# Altium footprint library heromap.PcbLib: 593 footprints (part 2 of 38)
Each footprint in its own frame and in the unit in brackets; x right, y up, seen from the top. Pads: shape width x height; smd on the part's side, far side on the other; paste and mask are expansions set on the pad; w line width, h text height; cw(c..) or ccw(c..) is an arc to the next point about the centre after c.
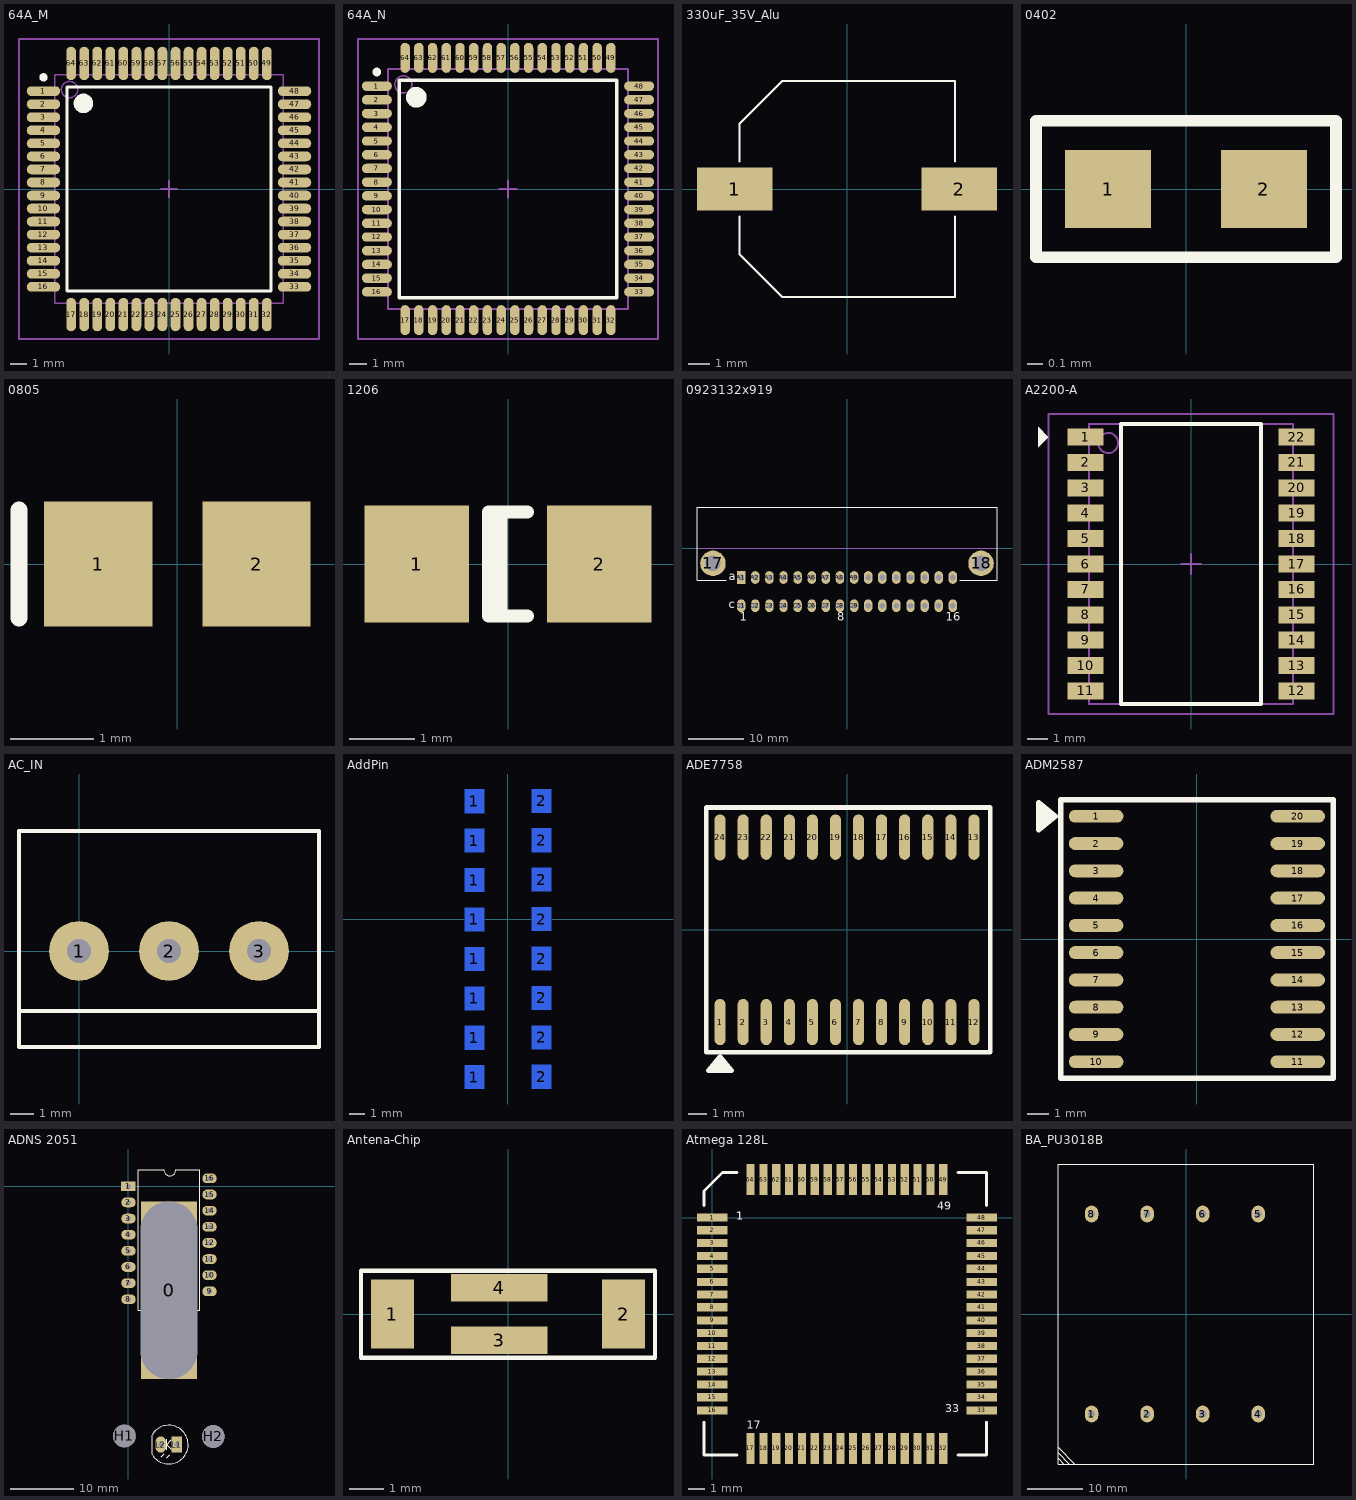
[diagram p1: the footprints below, top view; thin cyan lines are the x and y axes]

## 64A_M [mm] "Thin QFP, 64-Leads, Body 14x14mm, Pitch 0.8mm, IPC Low Density"
height 1.2
pads (64):
  oval 2.05x0.6 smd: 1(-7.7,6) 2(-7.7,5.2) 3(-7.7,4.4) 4(-7.7,3.6) 5(-7.7,2.8) 6(-7.7,2) 7(-7.7,1.2) 8(-7.7,0.4) 9(-7.7,-0.4) 10(-7.7,-1.2) 11(-7.7,-2) 12(-7.7,-2.8) 13(-7.7,-3.6) 14(-7.7,-4.4) 15(-7.7,-5.2) 16(-7.7,-6) 33(7.7,-6) 34(7.7,-5.2) 35(7.7,-4.4) 36(7.7,-3.6) 37(7.7,-2.8) 38(7.7,-2) 39(7.7,-1.2) 40(7.7,-0.4) 41(7.7,0.4) 42(7.7,1.2) 43(7.7,2) 44(7.7,2.8) 45(7.7,3.6) 46(7.7,4.4) 47(7.7,5.2) 48(7.7,6)
  oval 0.6x2.05 smd: 17(-6,-7.7) 18(-5.2,-7.7) 19(-4.4,-7.7) 20(-3.6,-7.7) 21(-2.8,-7.7) 22(-2,-7.7) 23(-1.2,-7.7) 24(-0.4,-7.7) 25(0.4,-7.7) 26(1.2,-7.7) 27(2,-7.7) 28(2.8,-7.7) 29(3.6,-7.7) 30(4.4,-7.7) 31(5.2,-7.7) 32(6,-7.7) 49(6,7.7) 50(5.2,7.7) 51(4.4,7.7) 52(3.6,7.7) 53(2.8,7.7) 54(2,7.7) 55(1.2,7.7) 56(0.4,7.7) 57(-0.4,7.7) 58(-1.2,7.7) 59(-2,7.7) 60(-2.8,7.7) 61(-3.6,7.7) 62(-4.4,7.7) 63(-5.2,7.7) 64(-6,7.7)
Top Overlay:
  circle w0.25: c-7.7,6.85 r0.125
  circle w0.6: c-5.25,5.25 r0.3
  lines w0.2: -6.25,-6.25 -6.25,6.25 6.25,6.25 6.25,-6.25 -6.25,-6.25
Mechanical 13:
  circle w0.1: c-6.1,6.1 r0.5
  lines w0.1: -7,-7 -7,7 7,7 7,-7 -7,-7
Mechanical 15:
  lines w0.1: -0.5,0 0.5,0 ; 0,-0.5 0,0.5 ; -9.2,-9.2 -9.2,9.2 9.2,9.2 9.2,-9.2 -9.2,-9.2
3D body: height 1.2, standoff 0, extent -7,-7 7,7

## 64A_N [mm] "Thin QFP, 64-Leads, Body 14x14mm, Pitch 0.8mm, IPC Medium Density"
height 1.2
pads (64):
  oval 1.75x0.55 smd: 1(-7.65,6) 2(-7.65,5.2) 3(-7.65,4.4) 4(-7.65,3.6) 5(-7.65,2.8) 6(-7.65,2) 7(-7.65,1.2) 8(-7.65,0.4) 9(-7.65,-0.4) 10(-7.65,-1.2) 11(-7.65,-2) 12(-7.65,-2.8) 13(-7.65,-3.6) 14(-7.65,-4.4) 15(-7.65,-5.2) 16(-7.65,-6) 33(7.65,-6) 34(7.65,-5.2) 35(7.65,-4.4) 36(7.65,-3.6) 37(7.65,-2.8) 38(7.65,-2) 39(7.65,-1.2) 40(7.65,-0.4) 41(7.65,0.4) 42(7.65,1.2) 43(7.65,2) 44(7.65,2.8) 45(7.65,3.6) 46(7.65,4.4) 47(7.65,5.2) 48(7.65,6)
  oval 0.55x1.75 smd: 17(-6,-7.65) 18(-5.2,-7.65) 19(-4.4,-7.65) 20(-3.6,-7.65) 21(-2.8,-7.65) 22(-2,-7.65) 23(-1.2,-7.65) 24(-0.4,-7.65) 25(0.4,-7.65) 26(1.2,-7.65) 27(2,-7.65) 28(2.8,-7.65) 29(3.6,-7.65) 30(4.4,-7.65) 31(5.2,-7.65) 32(6,-7.65) 49(6,7.65) 50(5.2,7.65) 51(4.4,7.65) 52(3.6,7.65) 53(2.8,7.65) 54(2,7.65) 55(1.2,7.65) 56(0.4,7.65) 57(-0.4,7.65) 58(-1.2,7.65) 59(-2,7.65) 60(-2.8,7.65) 61(-3.6,7.65) 62(-4.4,7.65) 63(-5.2,7.65) 64(-6,7.65)
Top Overlay:
  circle w0.6: c-5.35,5.35 r0.3
  circle w0.25: c-7.65,6.825 r0.125
  lines w0.2: -6.35,-6.35 6.35,-6.35 6.35,6.35 -6.35,6.35 -6.35,-6.35
Mechanical 13:
  circle w0.1: c-6.1,6.1 r0.5
  lines w0.1: -7,-7 7,-7 7,7 -7,7 -7,-7
Mechanical 15:
  lines w0.1: -0.5,0 0.5,0 ; 0,-0.5 0,0.5 ; -8.75,-8.75 8.75,-8.75 8.75,8.75 -8.75,8.75 -8.75,-8.75
3D body: height 1.2, standoff 0, extent -7,-7 7,7

## 330uF_35V_Alu [mm] "Tu 330uF/35V- 220uF/50V"
pads (2):
  rect 3.5x2 smd: 1(-5.2,0) 2(5.2,0)
Top Overlay:
  lines w0.102: -4.978,-1.27 -4.978,-3.023 -2.997,-5.004 ; -4.978,1.27 -4.978,3.023 -2.997,5.004 ; -3,-5 5,-5 5,-1.27 ; -3,5 5,5 5,1.27
3D body: height 10, standoff 2.6, extent -4.999,-4.999 4.999,4.999
3D body: height 2.1, standoff 0.2, extent -4.999,-4.999 4.999,4.999
3D body: height 2.6, standoff 2.1, extent -4.799,-4.799 4.799,4.799
3D body: height 10.01, standoff 10, extent 2.515,-4.318 5.004,4.318
3D body: height 0.2, standoff 0, extent -6.248,-0.508 -2.54,0.508
3D body: height 0.2, standoff 0, extent 2.54,-0.508 6.248,0.508
3D body: height 2.1, standoff 0.6, extent 1.27,-5.004 5.004,-1.016
3D body: height 2.1, standoff 0.6, extent 1.016,1.27 5.004,5.004
3D body: height 1.1, standoff 0.6, extent -4.978,-5.004 -1.245,-1.041
3D body: height 1.1, standoff 0.6, extent -4.978,1.27 -1.016,5.004
3D body: height 0.6, standoff 0.1, extent -4.978,-5.004 5.004,5.004

## 0402 [mil]
pads (2):
  rect 22x20 smd: 1(-20,0) 2(20,0)
Top Overlay:
  lines w3: -38.5,-17.5 -38.5,17.5 38.5,17.5 38.5,-17.5 -38.5,-17.5

## 0805 [mm] "Chip Capacitor; Body 2.0 x 1.2 mm (LxW typ)"
height 1.3
pads (2):
  rect 1.3x1.5 smd: 1(-0.95,0) 2(0.95,0)
Top Overlay:
  lines w0.2: -1.9,-0.65 -1.9,0.65

## 1206 [mm] "Chip Capacitor; Body 3.2 x 1.6 mm (LxW typ)"
height 1.5
pads (2):
  rect 1.6x1.8 smd: 1(-1.4,0) 2(1.4,0)
Top Overlay:
  lines w0.2: -0.11,-0.8 -0.11,0.8 ; 0.3,-0.8 -0.3,-0.8 -0.3,0.8 0.3,0.8

## 0923132x919 [mm] "Connector; DIN 41612, Type 2C, Thru-Hole; Rows a+c, 32 Position; Right Angle"
height 11.1
pads (34):
  round 4.6 hole 2.8: 17(-24.13,-2.76) 18(24.13,-2.76)
  rect 1.524x2.286 hole 1: A1(-19.05,-5.3)
  oval 1.524x2.286 hole 1: A2(-16.51,-5.3) A3(-13.97,-5.3) A4(-11.43,-5.3) A5(-8.89,-5.3) A6(-6.35,-5.3) A7(-3.81,-5.3) A8(-1.27,-5.3) A9(1.27,-5.3) A10(3.81,-5.3) A11(6.35,-5.3) A12(8.89,-5.3) A13(11.43,-5.3) A14(13.97,-5.3) A15(16.51,-5.3) A16(19.05,-5.3) C1(-19.05,-10.38) C2(-16.51,-10.38) C3(-13.97,-10.38) C4(-11.43,-10.38) C5(-8.89,-10.38) C6(-6.35,-10.38) C7(-3.81,-10.38) C8(-1.27,-10.38) C9(1.27,-10.38) C10(3.81,-10.38) C11(6.35,-10.38) C12(8.89,-10.38) C13(11.43,-10.38) C14(13.97,-10.38) C15(16.51,-10.38) C16(19.05,-10.38)
Top Overlay:
  lines w0.2: -21.75,-5.8 -27,-5.8 -27,7.34 27,7.34 27,-5.8 20.275,-5.8
  text "16" at 17.8,-13.08 h1.5
  text "8" at -1.77,-13.08 h1.5
  text "c" at -21.26,-10.88 h1.5
  text "a" at -21.26,-5.8 h1.5
  text "1" at -19.3,-13.08 h1.5
Mechanical 1:
  lines w0.1: -27,0 27,0
  text "PCB Edge" at -26.15,0.5 h0.6

## A2200-A [mm] "SOJ, 22-Leads, Body 14,0x12,0mm (max), Pitch 1,27mm, IPC Low Density"
height 0.8
pads (22):
  rect 1.8x0.85 smd: 1(-5.275,6.35) 2(-5.275,5.08) 3(-5.275,3.81) 4(-5.275,2.54) 5(-5.275,1.27) 6(-5.275,0) 7(-5.275,-1.27) 8(-5.275,-2.54) 9(-5.275,-3.81) 10(-5.275,-5.08) 11(-5.275,-6.35) 12(5.275,-6.35) 13(5.275,-5.08) 14(5.275,-3.81) 15(5.275,-2.54) 16(5.275,-1.27) 17(5.275,0) 18(5.275,1.27) 19(5.275,2.54) 20(5.275,3.81) 21(5.275,5.08) 22(5.275,6.35)
Top Overlay:
  region: -7.645,6.858 -7.137,6.35 -7.645,5.842
  lines w0.2: -3.5,-7 -3.5,7 3.5,7 3.5,-7 -3.5,-7
Mechanical 13:
  circle w0.1: c-4.15,6.05 r0.5
  lines w0.1: -5.1,-7 -5.1,7 5.1,7 5.1,-7 -5.1,-7
Mechanical 15:
  lines w0.1: -0.5,0 0.5,0 ; 0,-0.5 0,0.5 ; -7.125,-7.5 -7.125,7.5 7.125,7.5 7.125,-7.5 -7.125,-7.5
3D body: height 2, standoff 0.2, extent -4.394,-6.375 4.496,6.35
3D body: height 0.8, standoff 0.1, extent -5.1,-7 5.1,7

## AC_IN [mil] "AC_Input"
height 3
pads (3):
  round 100 hole 40 square: 1(0,0) 2(150,0) 3(300,0)
Top Overlay:
  lines w7: -100,-100 400,-100 ; -100,-160 400,-160 400,200 -100,200 -100,-160

## AddPin [mil] "Add"
pads (16):
  rect 50x60 smd far side: 1(-84,-400) 1(-84,-300) 1(-84,-200) 1(-84,-100) 1(-84,0) 1(-84,100) 1(-84,200) 1(-84,300) 2(86,-399) 2(86,-299) 2(86,-199) 2(86,-99) 2(86,1) 2(86,101) 2(86,201) 2(86,301)

## ADE7758 [mil]
pads (24):
  oval 24x100 smd: 1(-275,-200) 2(-225,-200) 3(-175,-200) 4(-125,-200) 5(-75,-200) 6(-25,-200) 7(25,-200) 8(75,-200) 9(125,-200) 10(175,-200) 11(225,-200) 12(275,-200) 24(-275,200)
  oval 24x98.43 smd: 13(275,200.79) 14(225,200.79) 15(175,200.79) 16(125,200.79) 17(75,200.79) 18(25,200.79) 19(-25,200.79) 20(-75,200.79) 21(-125,200.79) 22(-175,200.79) 23(-225,200.79)
Top Overlay:
  region: -275,-275 -300,-305 -250,-305
  lines w10: -305,-265 310,-265 310,265 -305,265 -305,-265 ; -300,-305 -275,-275 -250,-305 -300,-305
3D body: height 53.15, standoff 49.21, extent 265,137.01 285,187.01
3D body: height 53.15, standoff 0, extent 265,187.01 285,192.01
3D body: height 3.94, standoff 0, extent 265,192.01 285,222.01
3D body: height 3.94, standoff 0, extent 215,192.01 235,222.01
3D body: height 53.15, standoff 0, extent 215,187.01 235,192.01
3D body: height 53.15, standoff 49.21, extent 215,137.01 235,187.01
3D body: height 3.94, standoff 0, extent 165,192.01 185,222.01
3D body: height 53.15, standoff 0, extent 165,187.01 185,192.01
3D body: height 53.15, standoff 49.21, extent 165,137.01 185,187.01
3D body: height 3.94, standoff 0, extent 115,192.01 135,222.01
3D body: height 53.15, standoff 0, extent 115,187.01 135,192.01
3D body: height 53.15, standoff 49.21, extent 115,137.01 135,187.01
3D body: height 53.15, standoff 49.21, extent -85,137.01 -65,187.01
3D body: height 53.15, standoff 0, extent -85,187.01 -65,192.01
3D body: height 3.94, standoff 0, extent -85,192.01 -65,222.01
3D body: height 53.15, standoff 49.21, extent -35,137.01 -15,187.01
3D body: height 53.15, standoff 0, extent -35,187.01 -15,192.01
3D body: height 3.94, standoff 0, extent -35,192.01 -15,222.01
3D body: height 53.15, standoff 49.21, extent 15,137.01 35,187.01
3D body: height 53.15, standoff 0, extent 15,187.01 35,192.01
3D body: height 3.94, standoff 0, extent 15,192.01 35,222.01
3D body: height 3.94, standoff 0, extent 65,192.01 85,222.01
3D body: height 53.15, standoff 0, extent 65,187.01 85,192.01
3D body: height 53.15, standoff 49.21, extent 65,137.01 85,187.01
3D body: height 53.15, standoff 49.21, extent -285,137.01 -265,187.01
3D body: height 53.15, standoff 0, extent -285,187.01 -265,192.01
3D body: height 3.94, standoff 0, extent -285,192.01 -265,222.01
3D body: height 53.15, standoff 49.21, extent -235,137.01 -215,187.01
3D body: height 53.15, standoff 0, extent -235,187.01 -215,192.01
3D body: height 3.94, standoff 0, extent -235,192.01 -215,222.01
3D body: height 53.15, standoff 49.21, extent -185,137.01 -165,187.01
3D body: height 53.15, standoff 0, extent -185,187.01 -165,192.01
3D body: height 3.94, standoff 0, extent -185,192.01 -165,222.01
3D body: height 3.94, standoff 0, extent -135,192.01 -115,222.01
3D body: height 53.15, standoff 0, extent -135,187.01 -115,192.01
3D body: height 53.15, standoff 49.21, extent -135,137.01 -115,187.01
3D body: height 53.15, standoff 49.21, extent 115,-186.22 135,-136.22
3D body: height 53.15, standoff 0, extent 115,-191.22 135,-186.22
3D body: height 3.94, standoff 0, extent 115,-221.22 135,-191.22
3D body: height 3.94, standoff 0, extent 165,-221.22 185,-191.22
3D body: height 53.15, standoff 0, extent 165,-191.22 185,-186.22
3D body: height 53.15, standoff 49.21, extent 165,-186.22 185,-136.22
3D body: height 3.94, standoff 0, extent 215,-221.22 235,-191.22
3D body: height 53.15, standoff 0, extent 215,-191.22 235,-186.22
3D body: height 53.15, standoff 49.21, extent 215,-186.22 235,-136.22
3D body: height 3.94, standoff 0, extent 265,-221.22 285,-191.22
3D body: height 53.15, standoff 0, extent 265,-191.22 285,-186.22
3D body: height 53.15, standoff 49.21, extent 265,-186.22 285,-136.22
3D body: height 53.15, standoff 49.21, extent -85,-186.22 -65,-136.22
3D body: height 53.15, standoff 0, extent -85,-191.22 -65,-186.22
3D body: height 3.94, standoff 0, extent -85,-221.22 -65,-191.22
3D body: height 3.94, standoff 0, extent -35,-221.22 -15,-191.22
3D body: height 53.15, standoff 0, extent -35,-191.22 -15,-186.22
3D body: height 53.15, standoff 49.21, extent -35,-186.22 -15,-136.22
3D body: height 3.94, standoff 0, extent 15,-221.22 35,-191.22
3D body: height 53.15, standoff 0, extent 15,-191.22 35,-186.22
3D body: height 53.15, standoff 49.21, extent 15,-186.22 35,-136.22
3D body: height 3.94, standoff 0, extent 65,-221.22 85,-191.22
3D body: height 53.15, standoff 0, extent 65,-191.22 85,-186.22
3D body: height 53.15, standoff 49.21, extent 65,-186.22 85,-136.22
3D body: height 53.15, standoff 49.21, extent -135,-186.22 -115,-136.22
3D body: height 53.15, standoff 0, extent -135,-191.22 -115,-186.22
3D body: height 3.94, standoff 0, extent -135,-221.22 -115,-191.22
3D body: height 53.15, standoff 49.21, extent -185,-186.22 -165,-136.22
3D body: height 53.15, standoff 0, extent -185,-191.22 -165,-186.22
3D body: height 3.94, standoff 0, extent -185,-221.22 -165,-191.22
3D body: height 53.15, standoff 49.21, extent -235,-186.22 -215,-136.22
3D body: height 53.15, standoff 0, extent -235,-191.22 -215,-186.22
3D body: height 3.94, standoff 0, extent -235,-221.22 -215,-191.22
3D body: height 3.94, standoff 0, extent -285,-221.22 -265,-191.22
3D body: height 53.15, standoff 0, extent -285,-191.22 -265,-186.22
3D body: height 53.15, standoff 49.21, extent -285,-186.22 -265,-136.22
3D body: height 104.33, standoff 0, extent -299.98,-150 299.98,150

## ADM2587 [mm]
pads (20):
  oval 2.54x0.6 smd: 1(-4.695,5.715) 2(-4.695,4.445) 3(-4.695,3.175) 4(-4.695,1.905) 5(-4.695,0.635) 6(-4.695,-0.635) 7(-4.695,-1.905) 8(-4.695,-3.175) 9(-4.695,-4.445) 10(-4.695,-5.715) 11(4.695,-5.715) 12(4.695,-4.445) 13(4.695,-3.175) 14(4.695,-1.905) 15(4.695,-0.635) 16(4.695,0.635) 17(4.695,1.905) 18(4.695,3.175) 19(4.695,4.445) 20(4.695,5.715)
Top Overlay:
  region: -6.604,5.715 -7.366,6.35 -7.366,5.08
  lines w0.254: -7.366,5.08 -6.604,5.715 -7.366,6.35 -7.366,5.08 ; -6.35,-6.477 -6.35,6.477 6.35,6.477 6.35,-6.477 -6.35,-6.477
3D body: height 1.38, standoff 1.28, extent 3.658,-5.969 4.089,-5.461
3D body: height 1.38, standoff 0, extent 4.089,-5.969 4.191,-5.461
3D body: height 0.1, standoff 0, extent 4.191,-5.969 5.029,-5.461
3D body: height 0.1, standoff 0, extent 4.191,-4.699 5.029,-4.191
3D body: height 1.38, standoff 0, extent 4.089,-4.699 4.191,-4.191
3D body: height 1.38, standoff 1.28, extent 3.658,-4.699 4.089,-4.191
3D body: height 0.1, standoff 0, extent 4.191,-3.429 5.029,-2.921
3D body: height 1.38, standoff 0, extent 4.089,-3.429 4.191,-2.921
3D body: height 1.38, standoff 1.28, extent 3.658,-3.429 4.089,-2.921
3D body: height 0.1, standoff 0, extent 4.191,-2.159 5.029,-1.651
3D body: height 1.38, standoff 0, extent 4.089,-2.159 4.191,-1.651
3D body: height 1.38, standoff 1.28, extent 3.658,-2.159 4.089,-1.651
3D body: height 0.1, standoff 0, extent 4.191,-0.889 5.029,-0.381
3D body: height 1.38, standoff 0, extent 4.089,-0.889 4.191,-0.381
3D body: height 1.38, standoff 1.28, extent 3.658,-0.889 4.089,-0.381
3D body: height 0.1, standoff 0, extent 4.191,0.381 5.029,0.889
3D body: height 1.38, standoff 0, extent 4.089,0.381 4.191,0.889
3D body: height 1.38, standoff 1.28, extent 3.658,0.381 4.089,0.889
3D body: height 0.1, standoff 0, extent 4.191,1.651 5.029,2.159
3D body: height 1.38, standoff 0, extent 4.089,1.651 4.191,2.159
3D body: height 1.38, standoff 1.28, extent 3.658,1.651 4.089,2.159
3D body: height 0.1, standoff 0, extent 4.191,2.921 5.029,3.429
3D body: height 1.38, standoff 0, extent 4.089,2.921 4.191,3.429
3D body: height 1.38, standoff 1.28, extent 3.658,2.921 4.089,3.429
3D body: height 0.1, standoff 0, extent 4.191,4.191 5.029,4.699
3D body: height 1.38, standoff 0, extent 4.089,4.191 4.191,4.699
3D body: height 1.38, standoff 1.28, extent 3.658,4.191 4.089,4.699
3D body: height 0.1, standoff 0, extent 4.191,5.461 5.029,5.969
3D body: height 1.38, standoff 0, extent 4.089,5.461 4.191,5.969
3D body: height 1.38, standoff 1.28, extent 3.658,5.461 4.089,5.969
3D body: height 1.38, standoff 1.28, extent -4.115,-5.969 -3.683,-5.461
3D body: height 1.38, standoff 0, extent -4.216,-5.969 -4.115,-5.461
3D body: height 0.1, standoff 0, extent -5.055,-5.969 -4.216,-5.461
3D body: height 1.38, standoff 1.28, extent -4.115,-4.699 -3.683,-4.191
3D body: height 1.38, standoff 0, extent -4.216,-4.699 -4.115,-4.191
3D body: height 0.1, standoff 0, extent -5.055,-4.699 -4.216,-4.191
3D body: height 1.38, standoff 1.28, extent -4.115,-3.429 -3.683,-2.921
3D body: height 1.38, standoff 0, extent -4.216,-3.429 -4.115,-2.921
3D body: height 0.1, standoff 0, extent -5.055,-3.429 -4.216,-2.921
3D body: height 1.38, standoff 1.28, extent -4.115,-2.159 -3.683,-1.651
3D body: height 1.38, standoff 0, extent -4.216,-2.159 -4.115,-1.651
3D body: height 0.1, standoff 0, extent -5.055,-2.159 -4.216,-1.651
3D body: height 1.38, standoff 1.28, extent -4.115,-0.889 -3.683,-0.381
3D body: height 1.38, standoff 0, extent -4.216,-0.889 -4.115,-0.381
3D body: height 0.1, standoff 0, extent -5.055,-0.889 -4.216,-0.381
3D body: height 1.38, standoff 1.28, extent -4.115,0.381 -3.683,0.889
3D body: height 1.38, standoff 0, extent -4.216,0.381 -4.115,0.889
3D body: height 0.1, standoff 0, extent -5.055,0.381 -4.216,0.889
3D body: height 1.38, standoff 1.28, extent -4.115,1.651 -3.683,2.159
3D body: height 1.38, standoff 0, extent -4.216,1.651 -4.115,2.159
3D body: height 0.1, standoff 0, extent -5.055,1.651 -4.216,2.159
3D body: height 1.38, standoff 1.28, extent -4.115,2.921 -3.683,3.429
3D body: height 1.38, standoff 0, extent -4.216,2.921 -4.115,3.429
3D body: height 0.1, standoff 0, extent -5.055,2.921 -4.216,3.429
3D body: height 1.38, standoff 1.28, extent -4.115,4.191 -3.683,4.699
3D body: height 1.38, standoff 0, extent -4.216,4.191 -4.115,4.699
3D body: height 0.1, standoff 0, extent -5.055,4.191 -4.216,4.699
3D body: height 0.1, standoff 0, extent -5.055,5.461 -4.216,5.969
3D body: height 1.38, standoff 0, extent -4.216,5.461 -4.115,5.969
3D body: height 1.38, standoff 1.28, extent -4.115,5.461 -3.683,5.969
3D body: height 2.65, standoff 0.2, extent -3.8,-6.5 3.8,6.5
3D body: height 2.66, standoff 0, extent -3.359,5.041 -2.341,6.059

## ADNS 2051 [mil] "Foots pin for Mouse"
pads (21):
  rect 350x1100 hole 350 slot 1100 at 90 deg: 0(251,-645)
  rect 90x60 hole 31: 1(0,0)
  oval 90x60 hole 31: 2(0,-100) 3(0,-200) 4(0,-300) 5(0,-400) 6(0,-500) 7(0,-600) 8(0,-700) 9(502,-651) 10(502,-551) 11(502,-451) 12(502,-351) 13(502,-251) 14(502,-151) 15(502,-51) 16(502,49)
  round 140 hole 140: H1(-25,-1547) H2(525,-1550)
  rect 65x100 hole 32: L1(300,-1600.5)
  oval 65x100 hole 32: L2(200,-1600.5)
Top Overlay:
  lines w7: 146,-1660.5 146,-1541.5 ; 146.06,-1540.53 cw(c250,-1600.5) 146.49,-1661.21 ; 204,-1675.5 221,-1658.5 ; 218,103 59,103 59,-767 443,-767 443,103 296,103 ; 218.97,101 ccw(c255.99,101) 293,101 ; 236,-1632.5 236,-1566.5 ; 238,-1681.5 255,-1664.5 ; 265,-1629.5 236,-1600.5 265,-1571.5 ; 394.94,-516.95 ccw(c252.8,-525.96) 395,-518
  text "ADNS2051" at 108,-229 h40

## Antena-Chip [mil]
pads (4):
  rect 49.22x78.74 smd: 1(-131.89,0) 2(131.89,0)
  rect 110.24x31.5 smd: 3(-10,-30) 4(-10,30)
Top Overlay:
  lines w5: -167.85,-49.74 167.85,-49.74 167.85,49.21 -167.85,49.21 -167.85,-49.74
3D body: height 47.24, standoff 1.97, extent -167.32,-49.21 167.32,49.21
3D body: height 47.64, standoff 0, extent -174,-52 -158,52
3D body: height 47.64, standoff 0, extent 157.99,-52.01 173.99,51.99

## Atmega 128L [mil] "Atmega 128L, 64 pin SMT"
height 100
pads (64):
  rect 75x20 smd: 1(0,0) 2(0,-31) 3(0,-62) 4(0,-94) 5(0,-125) 6(0,-157) 7(0,-188) 8(0,-219) 9(0,-251) 10(0,-282) 11(0,-314) 12(0,-345) 13(0,-376) 14(0,-408) 15(0,-439) 16(0,-471) 33(658,-471) 34(658,-439) 35(658,-408) 36(658,-376) 37(658,-345) 38(658,-314) 39(658,-282) 40(658,-251) 41(658,-219) 42(658,-188) 43(658,-157) 44(658,-125) 45(658,-94) 46(658,-62) 47(658,-31) 48(658,0)
  rect 20x75 smd: 17(93,-564) 18(125,-564) 19(156,-564) 20(187,-564) 21(219,-564) 22(250,-564) 23(282,-564) 24(313,-564) 25(344,-564) 26(376,-564) 27(407,-564) 28(439,-564) 29(470,-564) 30(501,-564) 31(533,-564) 32(564,-564) 49(564,93) 50(533,93) 51(501,93) 52(470,93) 53(439,93) 54(407,93) 55(376,93) 56(344,93) 57(313,93) 58(282,93) 59(250,93) 60(219,93) 61(187,93) 62(156,93) 63(125,93) 64(93,93)
Top Overlay:
  lines w7: -20,-500 -20,-580 60,-580 ; -20,30 -20,65 25,110 60,110 ; 600,-580 670,-580 670,-500 ; 600,110 670,110 670,30
  text "33" at 569,-475.5 h20
  text "17" at 84,-515.5 h20
  text "49" at 549,19.5 h20
  text "1" at 59,-5.5 h20
  text "1" at 59,-5.5 h20

## BA_PU3018B [mm]
pads (8):
  oval 2.413x3.048 hole 1.3: 1(-17,-18) 2(-7,-18) 3(3,-18) 5(13,18) 6(3,18) 7(-7,18) 8(-17,18)
  oval 2.413x3.048 hole 1.4: 4(13,-18)
Top Overlay:
  lines w0.203: -23,-26 -22,-27 ; -23,-25 -21,-27 ; -23,-24 -20,-27 ; -23,-27 23,-27 23,27 -23,27 -23,-27
3D body: height 30, standoff 0.5, extent -23,-27 23,27